# Altium integrated library Self made library.IntLib: 370 symbols (part 2 of 3) (continued)
## MAX1614 (continued)

## MAX3232CDW
designator IC?, comment RS232 Tranceiver
footprint PSOP-16
pins: 1 C1+, 2 V+, 3 C1-, 4 C2+, 5 C2-, 6 V-, 7 T2OUT (out), 8 R2IN, 9 R2OUT (out), 10 T2IN, 11 T1IN, 12 R1OUT (out), 13 R1IN, 14 T1OUT (out), 15 GND, 16 VCC

## MAX3318EIPWR
designator ?, comment Texas Instruments: MAX3318   2.5-V 460-kbps RS-232 TRANSCEIVER WITH ±15-kV ESD PROTECTION   The MAX3318 is a dual-driver, dual-receiver, RS-232 compatible transceiver. The device features auto-power-down plus and enhanced electrostatic discharge (ESD) protection integrated into the chip. Driver output and receiver input are protected to ±8 kV using the IEC 61000 Air-Gap Discharge method, ±8 kV using the IEC 61000 Contact Discharge method, and ±15 kV using the Human-Body Model (HBM). The device operates at a data rate of 460 kbps. The transceiver has a proprietary low-dropout driver output stage enabling RS-232-compatible operation from a 2.25-V to 3-V supply with a dual charge pump. The charge pump requires only four 0.1-mF capacitors and features a logic-level output (READY) that asserts when the charge pump is regulating and the device is ready to begin transmitting. The MAX3318 achieves a 1-mA supply current using the auto-power-down feature. This device automatically enters a low-power power-down mode when the RS-232 cable is disconnected or the drivers of the connected peripherals are inactive for more than 30 s. The device turns on again when it senses a valid transition at any driver or receiver input. Auto power down saves power without changes to the existing BIOS or operating system. This device is available in two space-saving packages: 20-pin SSOP and 20-pin TSSOP.
footprint TSSOP20
pins: 1 READY, 2 C1+, 3 V+, 4 C1-, 5 C2+, 6 C2-, 7 V-, 8 DOUT2, 9 RIN2, 10 ROUT2, 11 /INVALID, 12 DIN2, 13 DIN1, 14 FORCEON, 15 ROUT1, 16 RIN1, 17 DOUT1, 18 GND, 19 VCC, 20 /FORCEOFF

## MAX6765TTLD2+
designator ?, comment Automotive Micropower Linear Regulators with Supervisor
MANUFACTURER: Maxim Integrated; MANUFACTURER_PART_NUMBER: MAX6765TTLD2+T; UNIT_PRICE: 4.87; SUPPLIER: mouser; SUPPLIER_PART_NUMBER: 700-MAX6765TTLD2T
footprint 6-TDFN-EP
pins: 1 IN, 2, TH GND, 3 EN, 4 RST_N, 5 TIMEOUT, 6 OUT

## MAX17049
designator U?  Manufacturer Part Number 1: MAX17049G+  (hidden comment: *)
Manufacturer 1: Maxim Integrated; Description 1: Gestion de batterie/pile Host-Side Modelgauge (2-Cell); Tension de sortie: 0.4 V; Package/Boîte: TDFN-8; Série: MAX17049; Minuteurs de sécurité de la charge: No Charge Safety Timers; Style de montage: SMD/SMT; Contrôle de la température: No Temperature Monitoring; Type de batterie: Li-Ion; Kit de développement: MAX17049EVKIT#; Température de fonctionnement max.: + 85 C; Température de fonctionnement min.: - 40 C; Courant d'alimentation de fonctionnement: 23 uA; Tension d'alimentation de fonctionnement: 2.5 V to 4.5 V; Type de produit: Fuel Gauges; Quantité standard du lot: 2000; Supplier 1: Mouser; Supplier Part Number 1: 700-MAX17049G+; RoHS: RoHS Compliant; Category: Gestion de batterie/pile; Stock 1: 1899; Pricing 1: 1=4.83, 25=4.39, 50=4.12, 100=3.30, 250=3.23, 500=3.08, 1000=2.96, 2000=2.86 (CHF); Marque: Maxim Integrated; Fabricant: Maxim Integrated; RoHS - Mouser: Y; Minimum Order Quantity: 1; Reeling: False; ComponentLink1URL: http://www.mouser.com/ds/2/256/MAX17048-MAX17049-84443.pdf; ComponentLink1Description: http://www.mouser.com/ds/2/256/MAX17048-MAX17049-84443.pdf
footprint 8 TDFN-EP (SON, 8-Leads, Body 2,00x2,00mm, Pitch 0,50mm, Thermal Pad 1,20x0,69mm, IPC Medium Density)
pins: 1 CTG, 2 CELL, 3 VDD, 4 GND, 5 ALRT, 6 QSTRT, 7 SCL, 8 SDA, 9 PAD

## MBR0530
designator D?, comment Schottky Rectifier  Manufacturer Part Number 1: MBR0530T1G
MANUFACTURER: Fairchild Semiconductor; MANUFACTURER_PART_NUMBER: MBR0530; Manufacturer 1: ON Semiconductor; UNIT_PRICE: 0.329; Description 1: Diodes et redresseurs Schottky 0.5A 30V; Configuration: Single; Package/Boîte: SOD-123; Conditionnement: Reel; Produit: Schottky Diodes; Technologie: Si; Style de montage: SMD/SMT; If - Courant direct: 0.5 A; Ifsm - Courant de surtension direct: 5.5 A; Ir - Courant inverse: 130 uA; Température de fonctionnement max.: + 125 C; Température de fonctionnement min.: - 65 C; Catégorie du produit: Diodes- Schottky; Quantité standard du lot: 3000; Vf - Tension directe: 0.43 V; Vrrm - Tension inverse répétitive: 30 V; SUPPLIER: Mouser; SUPPLIER_PART_NUMBER: 512-MBR0530; Supplier 1: Mouser; Supplier Part Number 1: 863-MBR0530T1G; RoHS: RoHS Compliant; Category: Diodes et redresseurs Schottky; Stock 1: 101635; Pricing 1: 1=0.342, 10=0.226, 100=0.095, 1000=0.065, 3000=0.050, 9000=0.043, 24000=0.040, 45000=0.038, 99000=0.033 (CHF); Série: MBR0530; Marque: ON Semiconductor; Fabricant: ON Semiconductor; RoHS - Mouser: Y; Minimum Order Quantity: 1; Reeling: True; ComponentLink1URL: http://www.mouser.com/ds/2/308/MBR0530T1-D-109532.pdf; ComponentLink1Description: http://www.mouser.com/ds/2/308/MBR0530T1-D-109532.pdf
footprint SOD123
pins: A, C

## MCBF7330-220MU
designator ?, comment MULTICOMP - MCBF7330 Inductors   -220MU : 22UH, 20%, 3.7ARMS
footprint MCBF7330
pins: 1, 2

## MCP1700SOT-23
designator U?, comment MCP1700   Low Quiescent Current LDO
footprint SOT23
pins: 1 GND, 2 VOUT, 3 VIN

## MCP1700SOT-89
designator U?, comment MCP1700   Low Quiescent Current LDO
footprint SOT-89
pins: 1 GND, 2 VIN, 3 VOUT

## MCP2551
designator U?  Supplier Part Number 1: 579-MCP2551-E/SN
CAN  Driver; Manufacturer: Microchip Technology; Manufacturer Part Number: MCP2551-E/SN; Data Rate: 1 Mbps; Operating Supply Voltage: 5 V; Supply Voltage - Max: 5.5 V; Supply Voltage - Min: 4.5 V; Digger CMP: CMP3574; Supplier 1: Mouser; RoHS: RoHS Compliant; Category: CAN Interface IC; Stock 1: 6549; Pricing 1: 1=1.27, 10=1.18, 25=0.974, 100=0.885 (CHF); Package/Case: SOIC-8; Packaging: Tube; Product: CAN Controllers; Type: Transceiver; Brand: Microchip Technology; Mounting Style: SMD/SMT; Maximum Operating Temperature: + 125 C; Minimum Operating Temperature: - 40 C; Product Category: Interface; Standard Pack Qty: 100; RoHS - Mouser: Y; Minimum Order Quantity: 1; Reeling: False; ComponentLink1URL: http://www.mouser.com/ds/2/268/21667d-63675.pdf; ComponentLink1Description: http://www.mouser.com/ds/2/268/21667d-63675.pdf
footprint SOIC-8
pins: 1 TXD, 2 GND, 3 VCC, 4 RXD, 5 VREF, 6 CANL, 7 CANH, 8 RS

## MCP251520-LEAD-TSSOP
designator U?, comment MCP2515   Stand-Alone CAN Controller With SPI Interface
footprint TSSOP20
pins: 1 TXCAN, 2 RXCAN, 3 CLKOUT, 4 TX0RTS, 5 TX1RTS, 7 TX2RTS, 8 OSC2, 9 OSC1, 10 GND, 11 RX1BF, 12 RX0BF, 13 INT, 14 SCK, 16 SI, 17 SO, 18 CS, 19 RESET, 20 VDD

## MIC5205-5.0YM5
designator ?, comment MIC5205   The MIC5205 is an efficient linear voltage regulator with ultra low-noise output, very low dropout voltage, and very low ground current. The MIC5205 offers better than 1% initial accuracy.   Vin max = 20V; I = 125mA; 1%
footprint SOT-23-5
pins: 1 IN, 2 GND, 3 EN, 4 BYP/ADJ, 5 OUT

## MICROSD_DM3CS-SF
designator ?, comment HRS: DM3CS-SF   microSD connector: Hinge, Push -Pull (no ejection mechanism), Top board mounting (Standard)
footprint DM3CS-SF
pins: 1 DAT2, 2 CD/DAT3, 3 CMD, 4 VDD, 5 CLK, 6 VSS, 7 DAT0, 8 DAT1, CA1 CASE@0, CA2 CASE@1, CA3 CASE@2, CA4 CASE@3, SW CD_SWITCH

## MIL-DIL-38999-17-22COAX
designator C?, comment MIL DIL-38999-17-22
footprint MIL-COAX
pins: A@1 1, A@2 2, A@3 3, A@4 4, SH@1 GND (power), SH@2 GND1 (power), SH@3 GND2 (power), SH@4 GND3 (power)

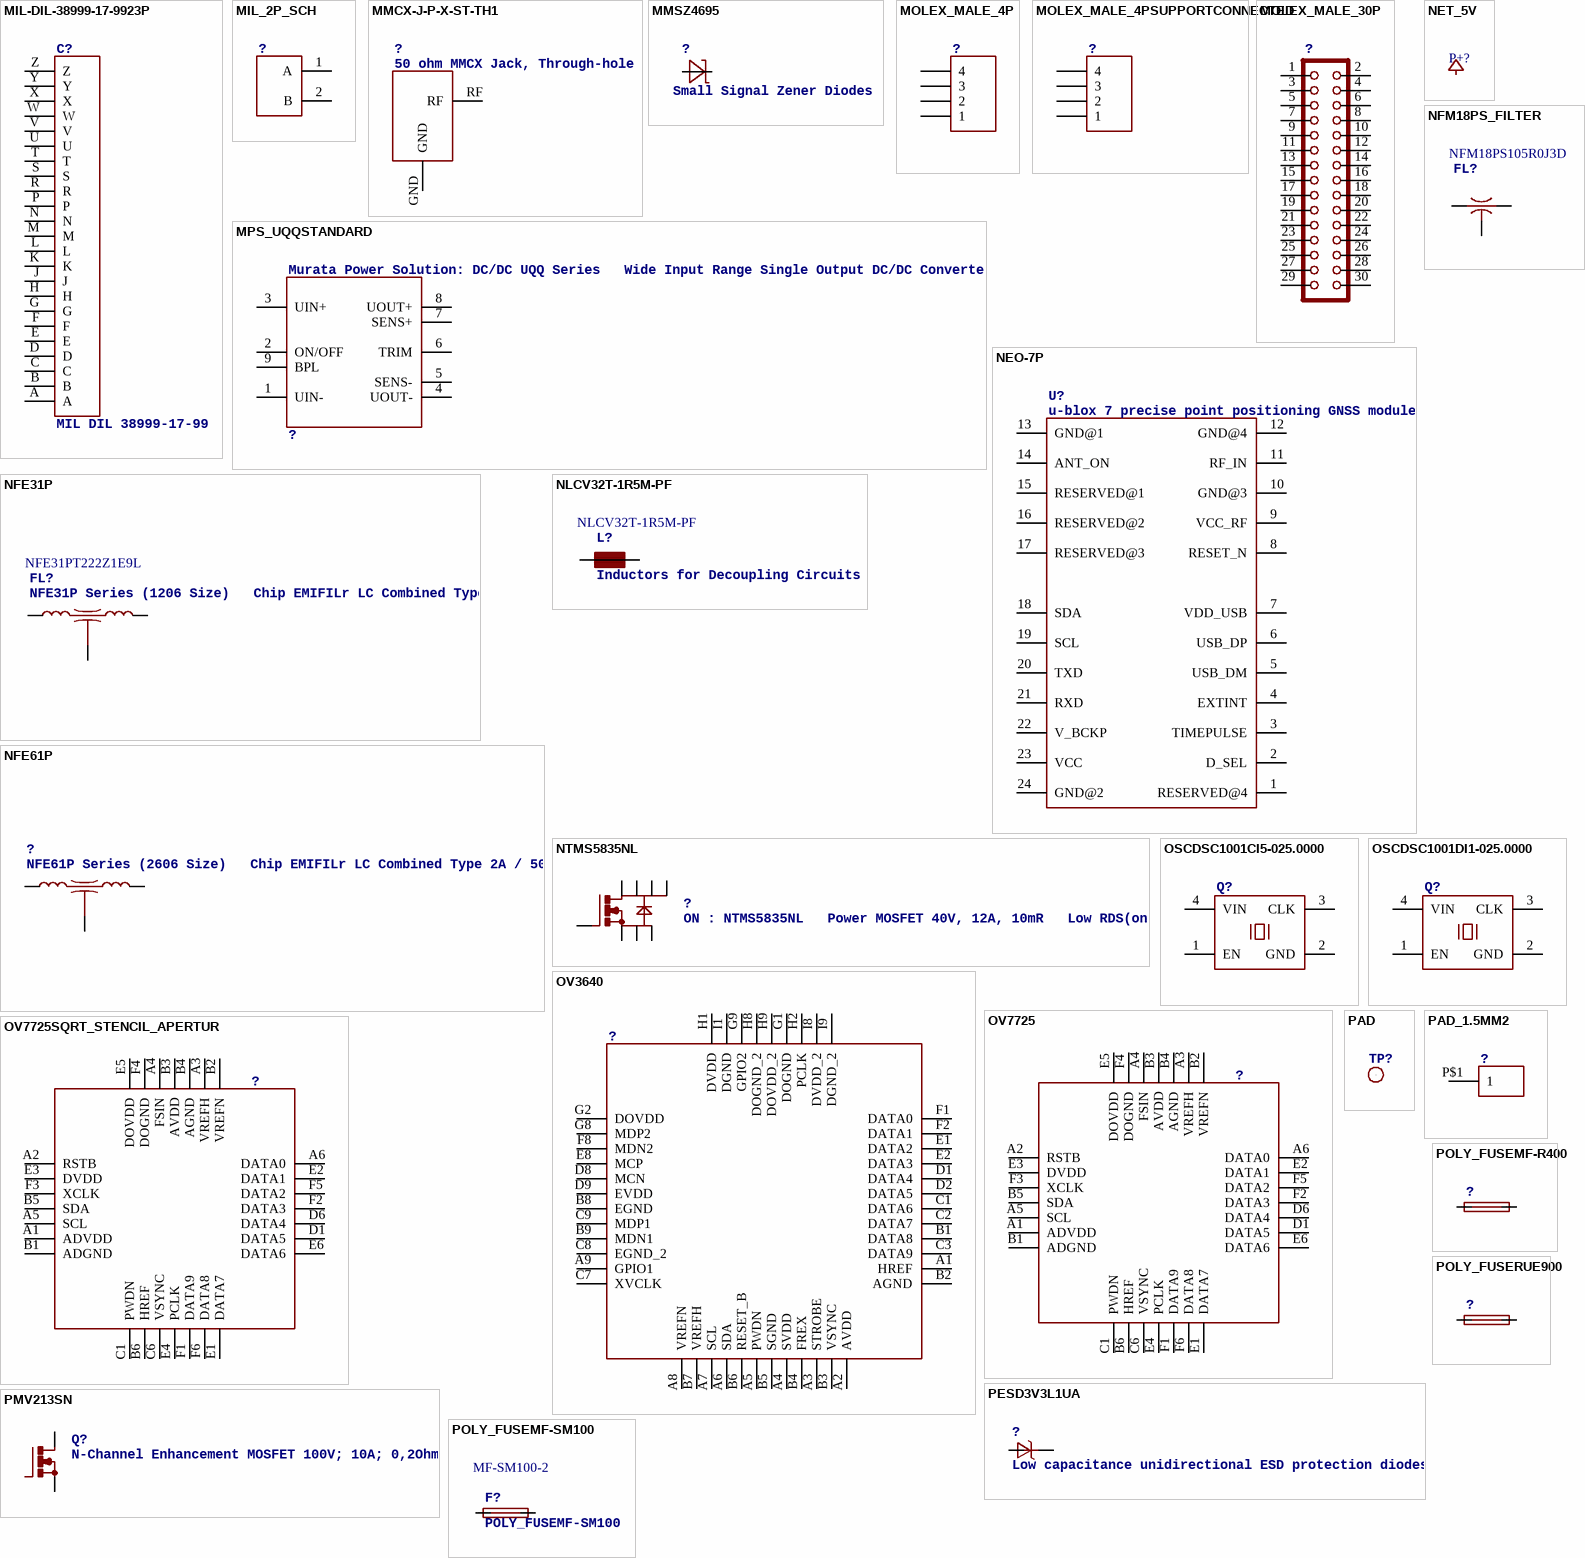
[diagram p14: symbols MIL-DIL-38999-17-9923P to POLY_FUSERUE900]

## MIL-DIL-38999-17-9923P
designator C?, comment MIL DIL 38999-17-99
footprint MIL-23P
pins: A, B, C, D, E, F, G, H, J, K, L, M, N, P, R, S, T, U, V, W, X, Y, Z

## MIL_2P_SCH
designator ?
footprint PAD_X2_1.1
pins: 1 A, 2 B

## MMCX-J-P-X-ST-TH1
designator ?, comment 50 ohm MMCX Jack, Through-hole
MANUFACTURER: Samtec; MANUFACTURER_PART_NUMBER: MMCX-J-P-H-ST-TH1; UNIT_PRICE: 2.33; SUPPLIER: Samtec; SUPPLIER_PART_NUMBER: MMCX-J-P-H-ST-TH1
footprint MMCX-J-P-X-ST-TH1
pins: GND, RF

## MMSZ4695
designator ?, comment Small Signal Zener Diodes
MANUFACTURER: Vishay Semiconductors; MANUFACTURER_PART_NUMBER: MMSZ4695-E3-08; UNIT_PRICE: 0.098; SUPPLIER: mouser; SUPPLIER_PART_NUMBER: 78-MMSZ4695-E3-08
footprint SOD123
pins: A, C

## MOLEX_MALE_4P
designator ?
MANUFACTURER: Molex; MANUFACTURER_PART_NUMBER: 104127-0410; UNIT_PRICE: 0.95; SUPPLIER: Mouser; SUPPLIER_PART_NUMBER: 538-104127-0410
footprint MOLEX_104127_4P
pins: 1, 2, 3, 4

## MOLEX_MALE_4PSUPPORTCONNECTED
designator ?
footprint MOLEX_104127_4P
pins: 1, 7 1, 2, 6 2, 3, 4

## MOLEX_MALE_30P
designator ?
MANUFACTURER: Molex; MANUFACTURER_PART_NUMBER: 54552-0302; UNIT_PRICE: 1.80; SUPPLIER: Mouser; SUPPLIER_PART_NUMBER: 538-54552-0302
footprint MOLEX_MALE_30P
pins: 1, 2, 3, 4, 5, 6, 7, 8, 9, 10, 11, 12, 13, 14, 15, 16, 17, 18, 19, 20, 21, 22, 23, 24, 25, 26, 27, 28, 29, 30

## MPS_UQQSTANDARD
designator ?, comment Murata Power Solution: DC/DC UQQ Series   Wide Input Range Single Output DC/DC Converters   For applications requiring wide range input, improved electrical and thermal perfomance consider Murata Power Solutions
footprint MPS_UQQ
pins: 1 UIN-, 2 ON/OFF, 3 UIN+, 4 UOUT-, 5 SENS-, 6 TRIM, 7 SENS+, 8 UOUT+, 9 BPL

## NEO-7P
designator U?, comment u-blox 7 precise point positioning GNSS module
MANUFACTURER: uBlox; MANUFACTURER_PART_NUMBER: NEO-7P-0; UNIT_PRICE: 182; SUPPLIER: uBlox; SUPPLIER_PART_NUMBER: NEO-7P-0
footprint NEO-7P
pins: 1 RESERVED@4, 2 D_SEL, 3 TIMEPULSE, 4 EXTINT, 5 USB_DM, 6 USB_DP, 7 VDD_USB, 8 RESET_N, 9 VCC_RF, 10 GND@3, 11 RF_IN, 12 GND@4, 13 GND@1, 14 ANT_ON, 15 RESERVED@1, 16 RESERVED@2, 17 RESERVED@3, 18 SDA, 19 SCL, 20 TXD, 21 RXD, 22 V_BCKP, 23 VCC, 24 GND@2

## NET_5V
designator P+?
pins: ?1 5V (oe)

## NFE31P
designator FL?, comment NFE31P Series (1206 Size)   Chip EMIFILr LC Combined Type  Manufacturer Part Number 1: NFE31PT222Z1E9L
MANUFACTURER: Murata Electronics; UNIT_PRICE: 0.579; Description 1: Condensateurs traversants 2200pF 25V 6A FILTER; Capacité électrique: 2200 pF; Courant nominal: 6 A; Package/Boîte: 1206 (3216 metric); Conditionnement: Reel; Produit: Three Terminal Network Filter Capacitors; Série: NFE; Style du raccordement: SMD/SMT; Tolérance: 50 %; Tension de voltage CC: 25 V; Borne de terre: 1 mm; Hauteur du boîtier: 1.6 mm; Longueur du boîtier: 3.2 mm; Résistance d'isolement: 1000 MOhms; Fabricant: Murata; Température de fonctionnement max.: + 85 C; Température de fonctionnement min.: - 40 C; Catégorie du produit: SMD EMI Filters/Chip Ferrite Beads; Quantité standard du lot: 2000; Nom commercial: EMIFIL; MANUFACTURER_PART_NUMBER: NFE31PT222Z1E9L; SUPPLIER: mouser; SUPPLIER_PART_NUMBER: 81-NFE31PT222Z1E9L; Supplier 1: Mouser; Supplier Part Number 1: 81-NFE31PT222Z1E9L; Manufacturer 1: Murata Electronics; RoHS: RoHS Compliant; Category: Condensateurs traversants; Stock 1: 23475; Pricing 1: 1=0.592, 10=0.376, 100=0.297, 500=0.279, 1000=0.236, 2000=0.215, 4000=0.198 (CHF); Plage de fréquences: -; Type: Chip Capacitor Block LC Combined Type; Marque: Murata Electronics; Largeur du boîtier: 1.6 mm; RoHS - Mouser: Y; Minimum Order Quantity: 1; Reeling: True; ComponentLink1URL: http://www.mouser.com/ds/2/281/L0112S0113NFE31P-339750.pdf; ComponentLink1Description: http://www.mouser.com/ds/2/281/L0112S0113NFE31P-339750.pdf
footprint LCL_NFE31P_V2
pins: 1, 2, 3

## NFE61P
designator ?, comment NFE61P Series (2606 Size)   Chip EMIFILr LC Combined Type 2A / 50V
footprint LCL_2606
pins: 1, 2 3, G 2

## NFM18PS_FILTER
designator FL?, comment Manufacturer Part Number 1: NFM18PS105R0J3D  (hidden comment: MURATA: NFM18PS Series   Chip EMIFILr Capacitor Type Chip EMIFILr for Large Current 0603)
MANUFACTURER: Murata Electronics; UNIT_PRICE: 0.206; Description 1: Condensateurs traversants 0603 1.0uF; Capacité électrique: 1 uF; Courant nominal: 2 A; Package/Boîte: 0603 (1608 metric); Conditionnement: Reel; Produit: Three Terminal Filter Capacitors; Série: NFM; Style du raccordement: SMD/SMT; Tolérance: 20 %; Tension de voltage CC: 6.3 V; Borne de terre: 0.8 mm; Hauteur du boîtier: 0.6 mm; Longueur du boîtier: 1.6 mm; Résistance d'isolement: 500 MOhms; Fabricant: Murata; Température de fonctionnement max.: + 105 C; Température de fonctionnement min.: - 55 C; Catégorie du produit: SMD EMI Filters/Chip Ferrite Beads; Quantité standard du lot: 4000; Nom commercial: EMIFIL; MANUFACTURER_PART_NUMBER: NFM18PS105R0J3D; SUPPLIER: mouser; SUPPLIER_PART_NUMBER: 81-NFM18PS105R0J3D; Supplier 1: Mouser; Supplier Part Number 1: 81-NFM18PS105R0J3D; Manufacturer 1: Murata Electronics; RoHS: RoHS Compliant; Category: Condensateurs traversants; Stock 1: 70256; Pricing 1: 1=0.229, 10=0.122, 100=0.092, 500=0.082, 1000=0.069, 4000=0.062, 8000=0.056, 12000=0.055 (CHF); Type: Three Terminal Capacitor; Marque: Murata Electronics; Largeur du boîtier: 0.8 mm; RoHS - Mouser: Y; Minimum Order Quantity: 1; Reeling: True; ComponentLink1URL: http://www.mouser.com/ds/2/281/L0111S0111NFM18PS-339747.pdf; ComponentLink1Description: http://www.mouser.com/ds/2/281/L0111S0111NFM18PS-339747.pdf
footprint NFM18PS
pins: 1, 2 3, G GND

## NLCV32T-1R5M-PF
designator L?, comment Inductors for Decoupling Circuits  Manufacturer Part Number 1: NLCV32T-1R5M-PF
MANUFACTURER: TDK; UNIT_PRICE: 0.265; Description 1: Inducteurs fixes 1.5uH 20%; Matériau intérieur: Ferrite; Bobinage: 1.5 uH; Courant CC max.: 830 mA; Résistance CC max.: 110 mOhms; Plage de températures de fonctionnement: - 40 C to + 105 C; Package/Boîte: 1210 (3225 metric); Conditionnement: Reel; Q minimum: 10; Fréquence de résonance propre: 80 MHz; Série: NLCV; Protection: Unshielded; Style du raccordement: SMD/SMT; Tolérance: 20 %; Hauteur du boîtier: 2.2 mm; Longueur du boîtier: 3.2 mm; Largeur du boîtier: 2.5 mm; Catégorie du produit: Wound SMD Inductors; Quantité standard du lot: 2000; Fréquence de test: 7.96 MHz; MANUFACTURER_PART_NUMBER: NLCV32T-1R5M-PF; SUPPLIER: mouser; SUPPLIER_PART_NUMBER: 810-NLCV32T-1R5M; Supplier 1: Mouser; Supplier Part Number 1: 810-NLCV32T-1R5M; Manufacturer 1: TDK; RoHS: RoHS Compliant; Category: Inducteurs fixes; Stock 1: 6025; Pricing 1: 1=0.270, 10=0.189, 100=0.153, 1000=0.124, 2000=0.087, 10000=0.084, 24000=0.081, 50000=0.079, 100000=0.076 (CHF); Produit: Inductors; Type: Decoupling Circuit; Marque: TDK; Fabricant: TDK; RoHS - Mouser: Y; Minimum Order Quantity: 1; Reeling: True; ComponentLink1URL: http://www.mouser.com/ds/2/400/tdk_inductorcommercialdecoupling_nlcv32-pf_en-533312.pdf; ComponentLink1Description: http://www.mouser.com/ds/2/400/tdk_inductorcommercialdecoupling_nlcv32-pf_en-533312.pdf
footprint NLCV32
pins: 1, 2

## NTMS5835NL
designator ?, comment ON : NTMS5835NL   Power MOSFET 40V, 12A, 10mR   Low RDS(on)
footprint SOIC8
pins: 1 S@0, 2 S@1, 3 S@2, 4 G, 5 D@0, 6 D@1, 7 D@2, 8 D@3

## OSCDSC1001CI5-025.0000
designator Q?
MANUFACTURER: Micrel; MANUFACTURER_PART_NUMBER: DSC1001CI5-025.0000; UNIT_PRICE: 2.20; SUPPLIER: Mouser; SUPPLIER_PART_NUMBER: 998-1001CI5-025.0000
footprint SMD_3.2X2.5MM_4P
pins: 1 EN, 2 GND, 3 CLK, 4 VIN

## OSCDSC1001DI1-025.0000
designator Q?
MANUFACTURER: Abracon; MANUFACTURER_PART_NUMBER: ASDMB-10.000MHZ-LC-T; UNIT_PRICE: 1.45; SUPPLIER: Mouser; SUPPLIER_PART_NUMBER: 815-ASDMB-10MHZ-LC
footprint SMD_2.5X2MM_4P
pins: 1 EN, 2 GND, 3 CLK, 4 VIN

## OV3640
designator ?
MANUFACTURER: OmniVision; MANUFACTURER_PART_NUMBER: OV3640-V56A
footprint OV3640
pins: A1 HREF, A2 AVDD, A3 STROBE, A4 SVDD, A5 PWDN, A6 SDA, A7 SCL, A8 VREFN, A9 GPIO1, B1 DATA8, B2 AGND, B3 VSYNC, B4 FREX, B5 SGND, B6 RESET_B, B7 VREFH, B8 EGND, B9 MDN1, C1 DATA6, C2 DATA7, C3 DATA9, C7 XVCLK, C8 EGND_2, C9 MDP1, D1 DATA4, D2 DATA5, D8 MCN, D9 EVDD, E1 DATA2, E2 DATA3, E8 MCP, F1 DATA0, F2 DATA1, F8 MDN2, G1 DOGND, G2 DOVDD, G8 MDP2, G9 GPIO2, H1 DVDD, H2 PCLK, H8 DOGND_2, H9 DOVDD_2, I1 DGND, I8 DVDD_2, I9 DGND_2

## OV7725
designator ?
footprint OV7725
pins: A1 ADVDD, A2 RSTB, A3 VREFH, A4 FSIN, A5 SCL, A6 DATA0, B1 ADGND, B2 VREFN, B3 AVDD, B4 AGND, B5 SDA, B6 HREF, C1 PWDN, C6 VSYNC, D1 DATA5, D6 DATA4, E1 DATA7, E2 DATA1, E3 DVDD, E4 PCLK, E5 DOVDD, E6 DATA6, F1 DATA9, F2 DATA3, F3 XCLK, F4 DOGND, F5 DATA2, F6 DATA8

## OV7725SQRT_STENCIL_APERTUR
designator ?
MANUFACTURER: OmniVision; MANUFACTURER_PART_NUMBER: OV07725-V28A; UNIT_PRICE: 6; SUPPLIER: Jotrin; SUPPLIER_PART_NUMBER: OV07725-V28A
footprint OV7725_SQRT_STENCIL_APERTUR
pins: A1 ADVDD, A2 RSTB, A3 VREFH, A4 FSIN, A5 SCL, A6 DATA0, B1 ADGND, B2 VREFN, B3 AVDD, B4 AGND, B5 SDA, B6 HREF, C1 PWDN, C6 VSYNC, D1 DATA5, D6 DATA4, E1 DATA7, E2 DATA1, E3 DVDD, E4 PCLK, E5 DOVDD, E6 DATA6, F1 DATA9, F2 DATA3, F3 XCLK, F4 DOGND, F5 DATA2, F6 DATA8

## PAD
designator TP?
footprint PAD_1MM
pins: P

## PAD_1.5MM2
designator ?
footprint PAD_1.5MM2
pins: P$1 1

## PESD3V3L1UA
designator ?, comment Low capacitance unidirectional ESD protection diodes
MANUFACTURER: NXP Semiconductors; MANUFACTURER_PART_NUMBER: PESD3V3L1UA,115; UNIT_PRICE: 0.333; SUPPLIER: mouser; SUPPLIER_PART_NUMBER: 771-PESD3V3L1UA115
footprint PESD3V3L1UA
pins: A, C

## PMV213SN
designator Q?, comment N-Channel Enhancement MOSFET 100V; 10A; 0,2Ohm
MANUFACTURER: NXP Semiconductors; MANUFACTURER_PART_NUMBER: PMV213SN,215; UNIT_PRICE: 0.5; SUPPLIER: mouser; SUPPLIER_PART_NUMBER: 771-PMV213SN215
footprint SOT23
pins: 1 G, 2 S, 3 D

## POLY_FUSEMF-R400
designator ?
footprint FUSE_MF-R400
pins: 1, 2

## POLY_FUSEMF-SM100
designator F?  Manufacturer Part Number: MF-SM100-2
Manufacturer: Bourns; Resistance: 480 mOhms; Type: PTC Resettable Fuses; Current Rating - Max: 80 A; Hold Current: 1.1 A; Maximum Voltage: 30 VDC; Trip Current: 2.2 A; Digger CMP: CMP4452; Supplier 1: Mouser; RoHS: RoHS Compliant; Category: Resettable Fuses - PPTC; Stock 1: 10317; Pricing 1: 1=0.487, 10=0.387, 100=0.322, 250=0.292, 500=0.249, 1000=0.246, 2000=0.246 (CHF); Dimensions: 7.98 mm L x 5.44 mm W x 3 mm  H; Operating Temperature Range: - 40 C to + 85 C; Package/Case: 2920 (7351 metric); Packaging: Reel; Series: MF-SM; Termination Style: SMD/SMT; Brand: Bourns; Mounting Style: SMD/SMT; Product Category: SMD Resettable Fuses; Standard Pack Qty: 2000; Tradename: Multifuse; RoHS - Mouser: Y; Minimum Order Quantity: 1; Reeling: True; ComponentLink1URL: http://www.mouser.com/ds/2/54/mfsm-48247.pdf; ComponentLink1Description: http://www.mouser.com/ds/2/54/mfsm-48247.pdf; Supplier Part Number 1: 652-MFSM100-2
footprint FUSE_MF-SM100
pins: 1, 2

## POLY_FUSERUE900
designator ?
footprint FUSE_RUE900
pins: 1, 2

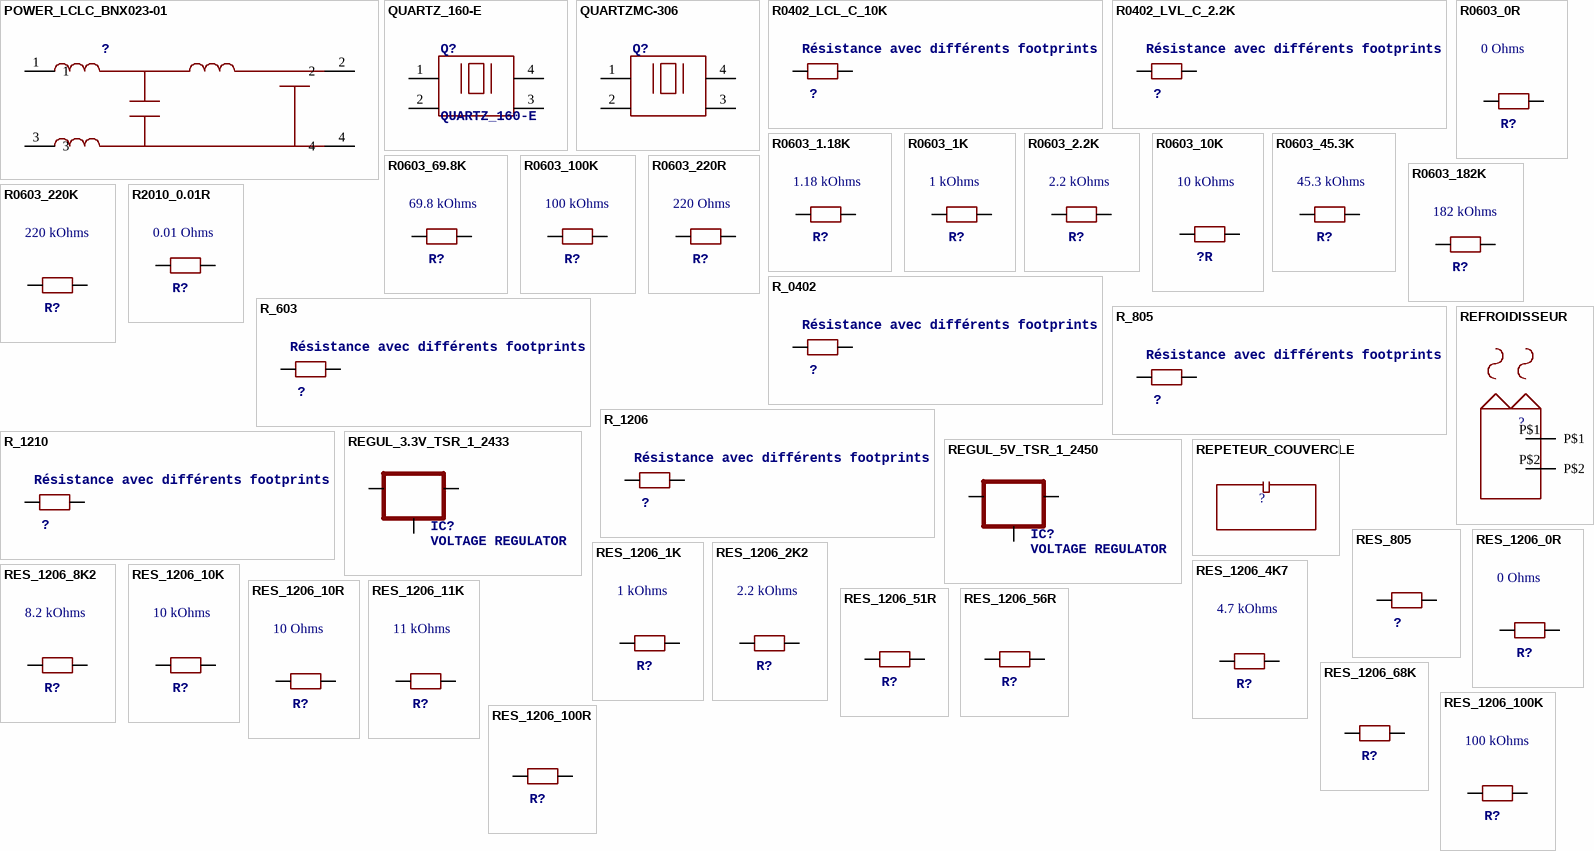
[diagram p15: symbols POWER_LCLC_BNX023-01 to RES_1206_100R]

## POWER_LCLC_BNX023-01
designator ?
footprint POWER_LCLC_BNX02
pins: 1, 2, 3, 4

## QUARTZ_160-E
designator Q?
Manufacturer: Saronix; Manufacturer Part Number: 49SNC160-E; Item ID: 1579823; Digger CMP: CMP4554; Package Quantity: 1; Supplier: Distrelec; Supplier Part Number: 644157
footprint 49SNC
pins: 1, 2, 3, 4

## QUARTZMC-306
designator Q?
footprint MC-306
pins: 1, 2, 3, 4

## R0402_LCL_C_10K
designator ?, comment Résistance avec différents footprints
MANUFACTURER_PART_NUMBER: CRCW040210K0FKED; MAN: Vishay; UNIT_PRICE: 0.08; SUPPLIER: Mouser; SUPPLIER_PART_NUMBER: 71-CRCW0402-10K-E3
footprint C0402_LVL_C
pins: 1, 2

## R0402_LVL_C_2.2K
designator ?, comment Résistance avec différents footprints
MANUFACTURER: Panasonic; MANUFACTURER_PART_NUMBER: ERJ-2RKF2201X; UNIT_PRICE: 0.1; SUPPLIER: Mouser; SUPPLIER_PART_NUMBER: 667-ERJ-2RKF2201X
footprint C0402_LVL_C
pins: 1, 2

## R0603_0R
designator R?  Résistance: 0 Ohms
Manufacturer 1: Vishay / Dale; Manufacturer Part Number 1: CRCW06030000Z0EA; Description 1: Résistances à couches épaisses - CMS 1/10watt ZEROohm Jumper; Plage de températures de fonctionnement: - 55 C to + 155 C; Package/Boîte: 0603 (1608 metric); Conditionnement: Reel; Produit: Thick Film Resistors Zero-Ohm; Série: CRCW; Code de caisse - po: 0603; Code de caisse - mm: 1608; Hauteur du boîtier: 0.45 mm; Longueur du boîtier: 1.55 mm; Largeur du boîtier: 0.85 mm; Fabricant: Vishay; Catégorie du produit: 0603 Thick Film Chip Resistors; Quantité standard du lot: 5000; Supplier 1: Mouser; Supplier Part Number 1: 71-CRCW0603-0-E3; RoHS: RoHS Compliant By Exemption; Category: Résistances à couches épaisses - CMS; Stock 1: 670259; Pricing 1: 1=0.096, 10=0.038, 100=0.022, 500=0.020, 1000=0.015, 5000=0.005, 10000=0.004, 50000=0.003 (CHF); Données de puissance: -; Coefficient de température: -; Tolérance: -; Tension de voltage: -; Marque: Vishay / Dale; RoHS - Mouser: E; Minimum Order Quantity: 1; Reeling: True; ComponentLink1URL: http://www.mouser.com/ds/2/427/dcrcwe3-109170.pdf; ComponentLink1Description: http://www.mouser.com/ds/2/427/dcrcwe3-109170.pdf
footprint R0603
pins: 1, 2

## R0603_1.18K
designator R?  Résistance: 1.18 kOhms
Manufacturer 1: Vishay / Dale; Manufacturer Part Number 1: CRCW06031K18FKEA; Description 1: Résistances à couches épaisses - CMS 1/10watt 1.18Kohms 1%; Plage de températures de fonctionnement: - 55 C to + 155 C; Package/Boîte: 0603 (1608 metric); Conditionnement: Reel; Données de puissance: 100 mW; Produit: Thick Film Resistors SMD; Série: CRCW; Coefficient de température: 100 PPM / K; Tolérance: 1 %; Tension de voltage: 75 V; Code de caisse - po: 0603; Code de caisse - mm: 1608; Hauteur du boîtier: 0.45 mm; Longueur du boîtier: 1.55 mm; Largeur du boîtier: 0.85 mm; Fabricant: Vishay; Catégorie du produit: 0603 Thick Film Chip Resistors; Quantité standard du lot: 5000; Supplier 1: Mouser; Supplier Part Number 1: 71-CRCW0603-1.18K-E3; RoHS: RoHS Compliant By Exemption; Category: Résistances à couches épaisses - CMS; Stock 1: 21026; Pricing 1: 1=0.096, 10=0.042, 100=0.025, 500=0.020, 1000=0.017, 5000=0.005, 50000=0.004 (CHF); Marque: Vishay / Dale; RoHS - Mouser: E; Minimum Order Quantity: 1; Reeling: True; ComponentLink1URL: http://www.mouser.com/ds/2/427/dcrcwe3-109170.pdf; ComponentLink1Description: http://www.mouser.com/ds/2/427/dcrcwe3-109170.pdf
footprint R0603
pins: 1, 2

## R0603_1K
designator R?  Résistance: 1 kOhms
Manufacturer 1: Vishay / Dale; Manufacturer Part Number 1: CRCW06031K00FKEB; Description 1: Résistances à couches épaisses - CMS 1/10watt 1Kohms 1%; Plage de températures de fonctionnement: - 55 C to + 155 C; Package/Boîte: 0603 (1608 metric); Conditionnement: Reel; Données de puissance: 100 mW; Produit: Thick Film Resistors SMD; Série: CRCW; Coefficient de température: 100 PPM / K; Tolérance: 1 %; Tension de voltage: 75 V; Code de caisse - po: 0603; Code de caisse - mm: 1608; Hauteur du boîtier: 0.45 mm; Longueur du boîtier: 1.55 mm; Largeur du boîtier: 0.85 mm; Fabricant: Vishay; Catégorie du produit: 0603 Thick Film Chip Resistors; Quantité standard du lot: 10000; Supplier 1: Mouser; Supplier Part Number 1: 71-CRCW06031K00FKEB; RoHS: RoHS Compliant By Exemption; Category: Résistances à couches épaisses - CMS; Stock 1: 29037; Pricing 1: 1=0.096, 10=0.013, 100=0.009, 1000=0.007, 10000=0.005, 30000=0.004, 50000=0.003 (CHF); Marque: Vishay / Dale; RoHS - Mouser: E; Minimum Order Quantity: 1; Reeling: True; ComponentLink1URL: http://www.mouser.com/ds/2/427/dcrcwe3-109170.pdf; ComponentLink1Description: http://www.mouser.com/ds/2/427/dcrcwe3-109170.pdf
footprint R0603
pins: 1, 2
